# Altium footprint library MyComponents_v2.5.PcbLib: 403 footprints (part 9 of 26)
Each footprint in its own frame and in the unit in brackets; x right, y up, seen from the top. Pads: shape width x height; smd on the part's side, far side on the other; paste and mask are expansions set on the pad; w line width, h text height; cw(c..) or ccw(c..) is an arc to the next point about the centre after c.
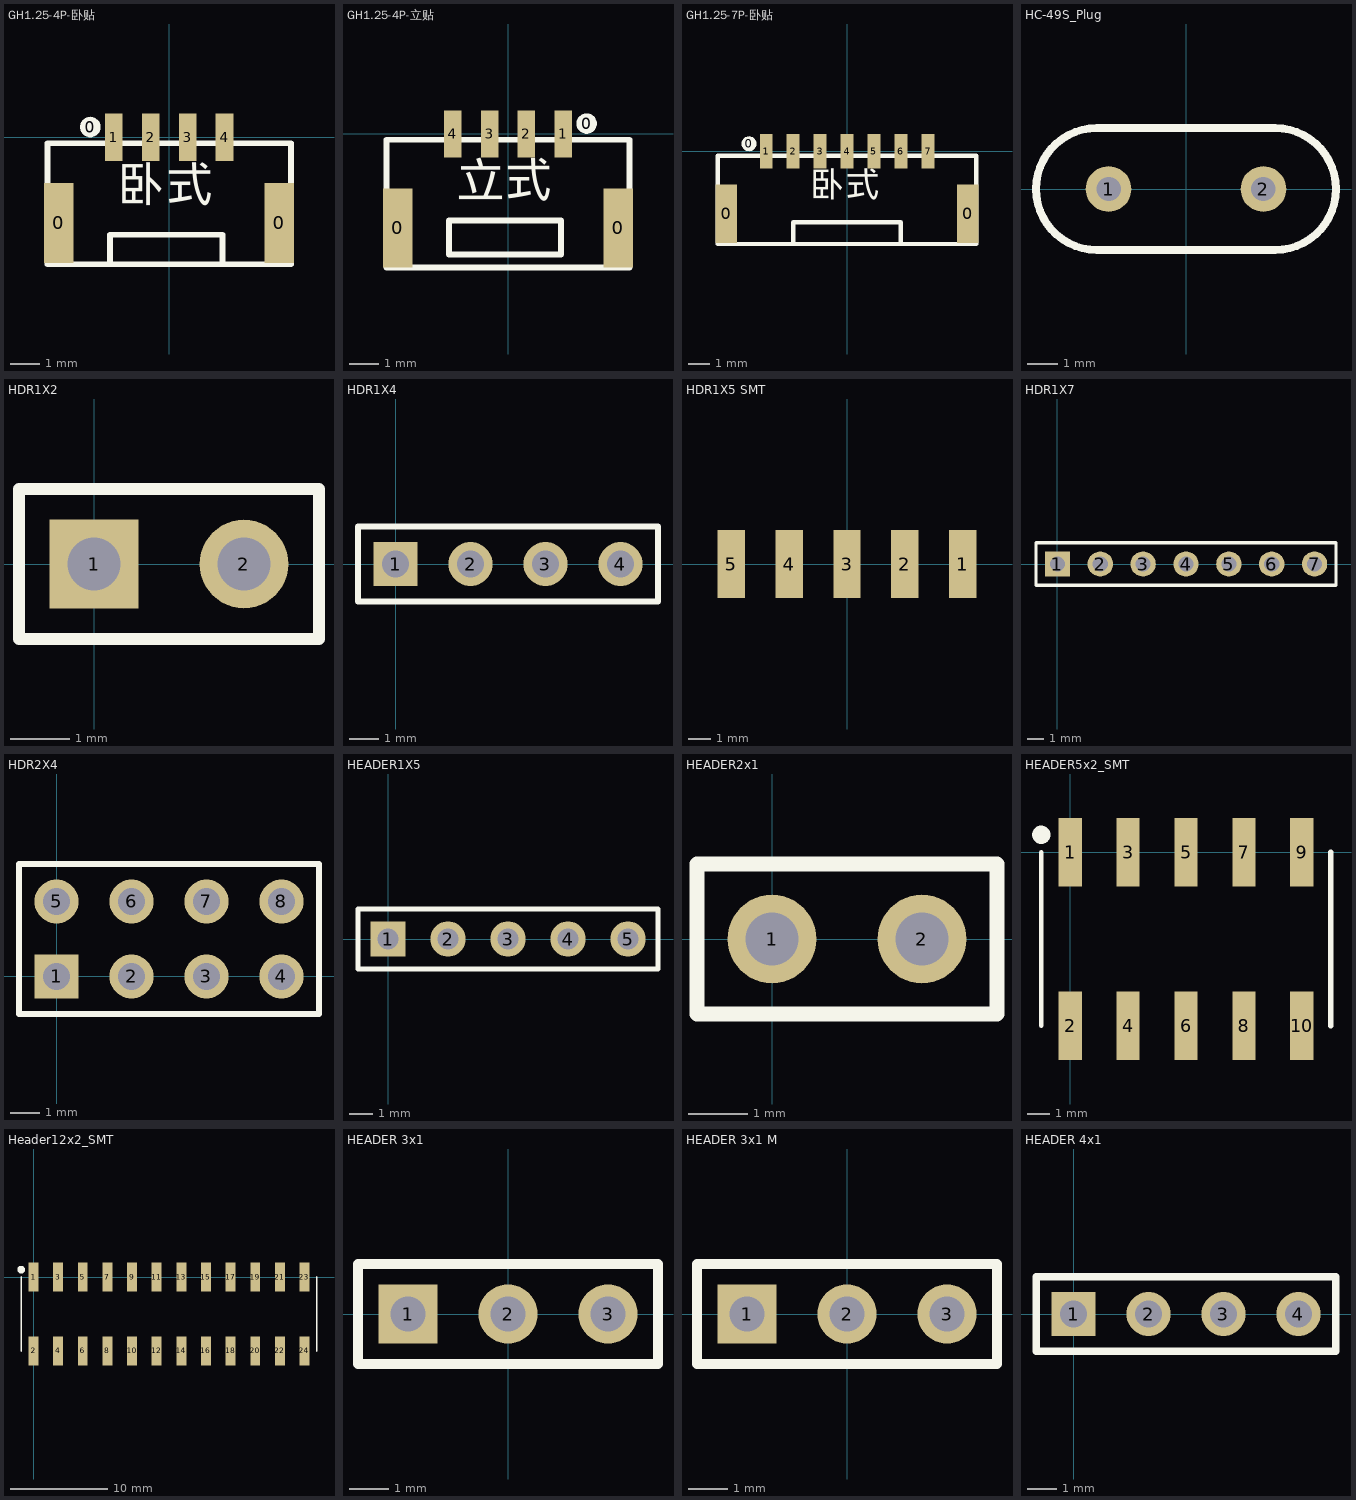
[diagram p8: the footprints below, top view; thin cyan lines are the x and y axes]

## GH1.25-4P-卧贴 [mm]
pads (7):
  rect 1x2.7 smd: 0(-3.74,-2.9) 0(3.725,-2.9)
  round 0.7 on Top Overlay: 0(-2.675,0.35)
  rect 0.6x1.6 smd: 1(-1.875,0) 2(-0.625,0) 3(0.625,0) 4(1.875,0)
Top Overlay:
  lines w0.2: -2,-4.3 -2,-3.3 1.8,-3.3 1.8,-4.3 ; -4.125,-4.3 -4.125,-0.2 4.125,-0.2 4.125,-4.3 -4.125,-4.3
  text "卧式" at -1.75,-2.55 h2.03
3D body "GH1.25AWR-4P.STEP": height 4.25, standoff -0.1, extent -4.125,-4.3 4.125,0.55

## GH1.25-4P-立贴 [mm]
pads (7):
  rect 1x2.7 smd: 0(-3.75,-3.2) 0(3.75,-3.2)
  round 0.7 on Top Overlay: 0(2.675,0.35)
  rect 0.6x1.6 smd: 1(1.875,0) 2(0.625,0) 3(-0.625,0) 4(-1.875,0)
Top Overlay:
  lines w0.2: -4.125,-4.55 -4.125,-0.2 4.125,-0.2 4.125,-4.55 -4.125,-4.55 ; -2,-4.1 -2,-2.95 1.8,-2.95 1.8,-4.1 -2,-4.1
  text "立式" at -1.75,-2.525 h2.03
3D body "GH1.25WF-4P.STEP": height 4.18, standoff -0.03, extent -4.125,-4.5 4.125,0.45

## GH1.25-7P-卧贴 [mm]
pads (10):
  rect 1x2.7 smd: 0(-5.615,-2.9) 0(5.615,-2.9)
  round 0.7 on Top Overlay: 0(-4.55,0.35)
  rect 0.6x1.6 smd: 1(-3.75,0) 2(-2.5,0) 3(-1.25,0) 4(0,0) 5(1.25,0) 6(2.5,0) 7(3.765,0)
Top Overlay:
  lines w0.2: -2.5,-4.3 -2.5,-3.3 2.4,-3.3 2.5,-3.3 2.5,-4.3 ; -6,-4.3 6,-4.3 6,-0.2 -6,-0.2 -6,-4.3
  text "卧式" at -1.7,-2.5 h2.03
3D body "GH1.25AWR-7P.STEP": height 4.25, standoff -0.1, extent -6,-4.2 6,0.65

## HC-49S_Plug [mm] "插件封装"
pads (2):
  round 1.5 hole 0.8: 1(-2.54,0) 2(2.54,0)
Top Overlay:
  lines w0.254: -2.921,-2 cw(c-2.921,0) -2.921,2 2.921,2 cw(c2.921,0) 2.921,-2 -2.921,-2
3D body "User Library-HC-49_LT_THT.STEP": height 3.6, standoff -1.99, extent -5.675,-2.312 5.675,2.338

## HDR1X2 [mm]
pads (2):
  rect 1.5x1.5 hole 0.9: 1(0,0)
  round 1.5 hole 0.9: 2(2.54,0)
Top Overlay:
  lines w0.2: -1.27,-1.27 3.81,-1.27 3.81,1.27 -1.27,1.27 -1.27,-1.27

## HDR1X4 [mm]
pads (4):
  rect 1.5x1.5 hole 0.9: 1(0,0)
  round 1.5 hole 0.9: 2(2.54,0) 3(5.08,0) 4(7.62,0)
Top Overlay:
  lines w0.2: -1.27,-1.27 -1.27,1.27 8.89,1.27 8.89,-1.27 -1.27,-1.27

## HDR1X5 SMT [mm]
pads (5):
  rect 1.2x3 smd: 1(5.08,0) 2(2.54,0) 3(0,0) 4(-2.54,0) 5(-5.08,0)
3D body "Header_Male_5Pin_black.STEP": height 1.54, standoff -0.94, extent -6.3,-1.295 6.4,10.245

## HDR1X7 [mm] "Connector; Header; 7 Position"
pads (7):
  rect 1.5x1.5 hole 0.9: 1(0,0)
  round 1.5 hole 0.9: 2(2.54,0) 3(5.08,0) 4(7.62,0) 5(10.16,0) 6(12.7,0) 7(15.24,0)
Top Overlay:
  lines w0.2: -1.27,-1.27 16.51,-1.27 16.51,1.27 -1.27,1.27 -1.27,-1.27

## HDR2X4 [mm] "Connector; Header; 4x2 Position"
pads (8):
  rect 1.5x1.5 hole 0.9: 1(0,0)
  round 1.5 hole 0.9: 2(2.54,0) 3(5.08,0) 4(7.62,0) 5(0,2.54) 6(2.54,2.54) 7(5.08,2.54) 8(7.62,2.54)
Top Overlay:
  lines w0.2: -1.27,-1.27 -1.27,3.81 8.89,3.81 8.89,-1.27 -1.27,-1.27

## HEADER1X5 [mm] "Connector; Header; 5 Position"
pads (5):
  rect 1.5x1.5 hole 0.9: 1(0,0)
  round 1.5 hole 0.9: 2(2.54,0) 3(5.08,0) 4(7.62,0) 5(10.16,0)
Top Overlay:
  lines w0.2: -1.27,-1.27 -1.27,1.27 11.43,1.27 11.43,-1.27 -1.27,-1.27
3D body "Header_Male_5Pin_black.STEP": height 8.54, standoff -3, extent -1.27,-1.245 11.43,1.245

## HEADER2x1 [mm]
pads (2):
  round 1.5 hole 0.9: 1(0,0) 2(2.54,0)
Top Overlay:
  lines w0.254: -1.27,-1.27 -1.27,1.27 3.81,1.27 3.81,-1.27 -1.27,-1.27
3D body "mill-max-800-10-001-10-002000.STEP": height 6.39, standoff -3.39, extent 1.27,-1.27 3.81,1.27
3D body "mill-max-800-10-001-10-002000.STEP": height 6.39, standoff -3.39, extent -1.27,-1.27 1.27,1.27

## HEADER5x2_SMT [mm]
pads (10):
  rect 1.02x3 smd: 1(0,0) 2(0,-7.62) 3(2.54,0) 4(2.54,-7.62) 5(5.08,0) 6(5.08,-7.62) 7(7.62,0) 8(7.62,-7.62) 9(10.16,0) 10(10.16,-7.62)
Top Overlay:
  circle w0.4: c-1.27,0.762 r0.2
  lines w0.2: -1.27,-7.62 -1.27,0
  lines w0.254: 11.43,-7.62 11.43,0
3D body "65709.stp": height 9.56, standoff -0.04, extent -1.27,-7.56 11.43,-0.06

## Header12x2_SMT [mm] "SMT footprint"
height 8.4
pads (24):
  rect 1.02x3 smd: 1(0,0) 2(0,-7.62) 3(2.54,0) 4(2.54,-7.62) 5(5.08,0) 6(5.08,-7.62) 7(7.62,0) 8(7.62,-7.62) 9(10.16,0) 10(10.16,-7.62) 11(12.7,0) 12(12.7,-7.62) 13(15.24,0) 14(15.24,-7.62) 15(17.78,0) 16(17.78,-7.62) 17(20.32,0) 18(20.32,-7.62) 19(22.86,0) 20(22.86,-7.62) 21(25.4,0) 22(25.4,-7.62) 23(27.94,0) 24(27.94,-7.62)
Top Overlay:
  circle w0.4: c-1.27,0.762 r0.2
  lines w0.2: -1.27,-7.62 -1.27,0 ; 29.21,-7.62 29.21,0
3D body "24-pin SMT header.STEP": height 10.3, standoff -0.01, extent -1.27,-7.811 29.21,0.191

## HEADER 3x1 [mm] "2.54mm排母"
pads (3):
  rect 1.5x1.5 hole 0.9: 1(-2.54,0)
  round 1.5 hole 0.9: 2(0,0) 3(2.54,0)
Top Overlay:
  lines w0.254: -3.81,-1.27 3.81,-1.27 3.81,1.27 -3.81,1.27 -3.81,-1.27
3D body "header2.54_3x1.step": height 8.38, standoff -2.54, extent -3.923,-1.275 3.823,1.265

## HEADER 3x1 M [mm] "2.54mm排母"
pads (3):
  rect 1.5x1.5 hole 0.9: 1(-2.54,0)
  round 1.5 hole 0.9: 2(0,0) 3(2.54,0)
Top Overlay:
  lines w0.254: -3.81,-1.27 -3.81,1.27 3.81,1.27 3.81,-1.27 -3.81,-1.27
3D body "User Library-RM254_3pin.STEP": height 6.02, standoff -3.1, extent -3.81,-1.27 3.81,1.27

## HEADER 4x1 [mm] "2.54mm 排针"
pads (4):
  rect 1.5x1.5 hole 0.9: 1(0,0)
  round 1.5 hole 0.9: 2(2.54,0) 3(5.08,0) 4(7.62,0)
Top Overlay:
  lines w0.254: -1.27,-1.27 8.89,-1.27 8.89,1.27 -1.27,1.27 -1.27,-1.27
3D body "mill-max-800-10-001-10-002000.STEP": height 6.39, standoff -3.39, extent 6.35,-1.27 8.89,1.27
3D body "mill-max-800-10-001-10-002000.STEP": height 6.39, standoff -3.39, extent 3.81,-1.27 6.35,1.27
3D body "mill-max-800-10-001-10-002000.STEP": height 6.39, standoff -3.39, extent 1.27,-1.27 3.81,1.27
3D body "mill-max-800-10-001-10-002000.STEP": height 6.39, standoff -3.39, extent -1.27,-1.27 1.27,1.27